# Altium footprint library PcbLib_jp.PcbLib: 178 footprints (part 10 of 12)
Each footprint in its own frame and in the unit in brackets; x right, y up, seen from the top. Pads: shape width x height; smd on the part's side, far side on the other; paste and mask are expansions set on the pad; w line width, h text height; cw(c..) or ccw(c..) is an arc to the next point about the centre after c.
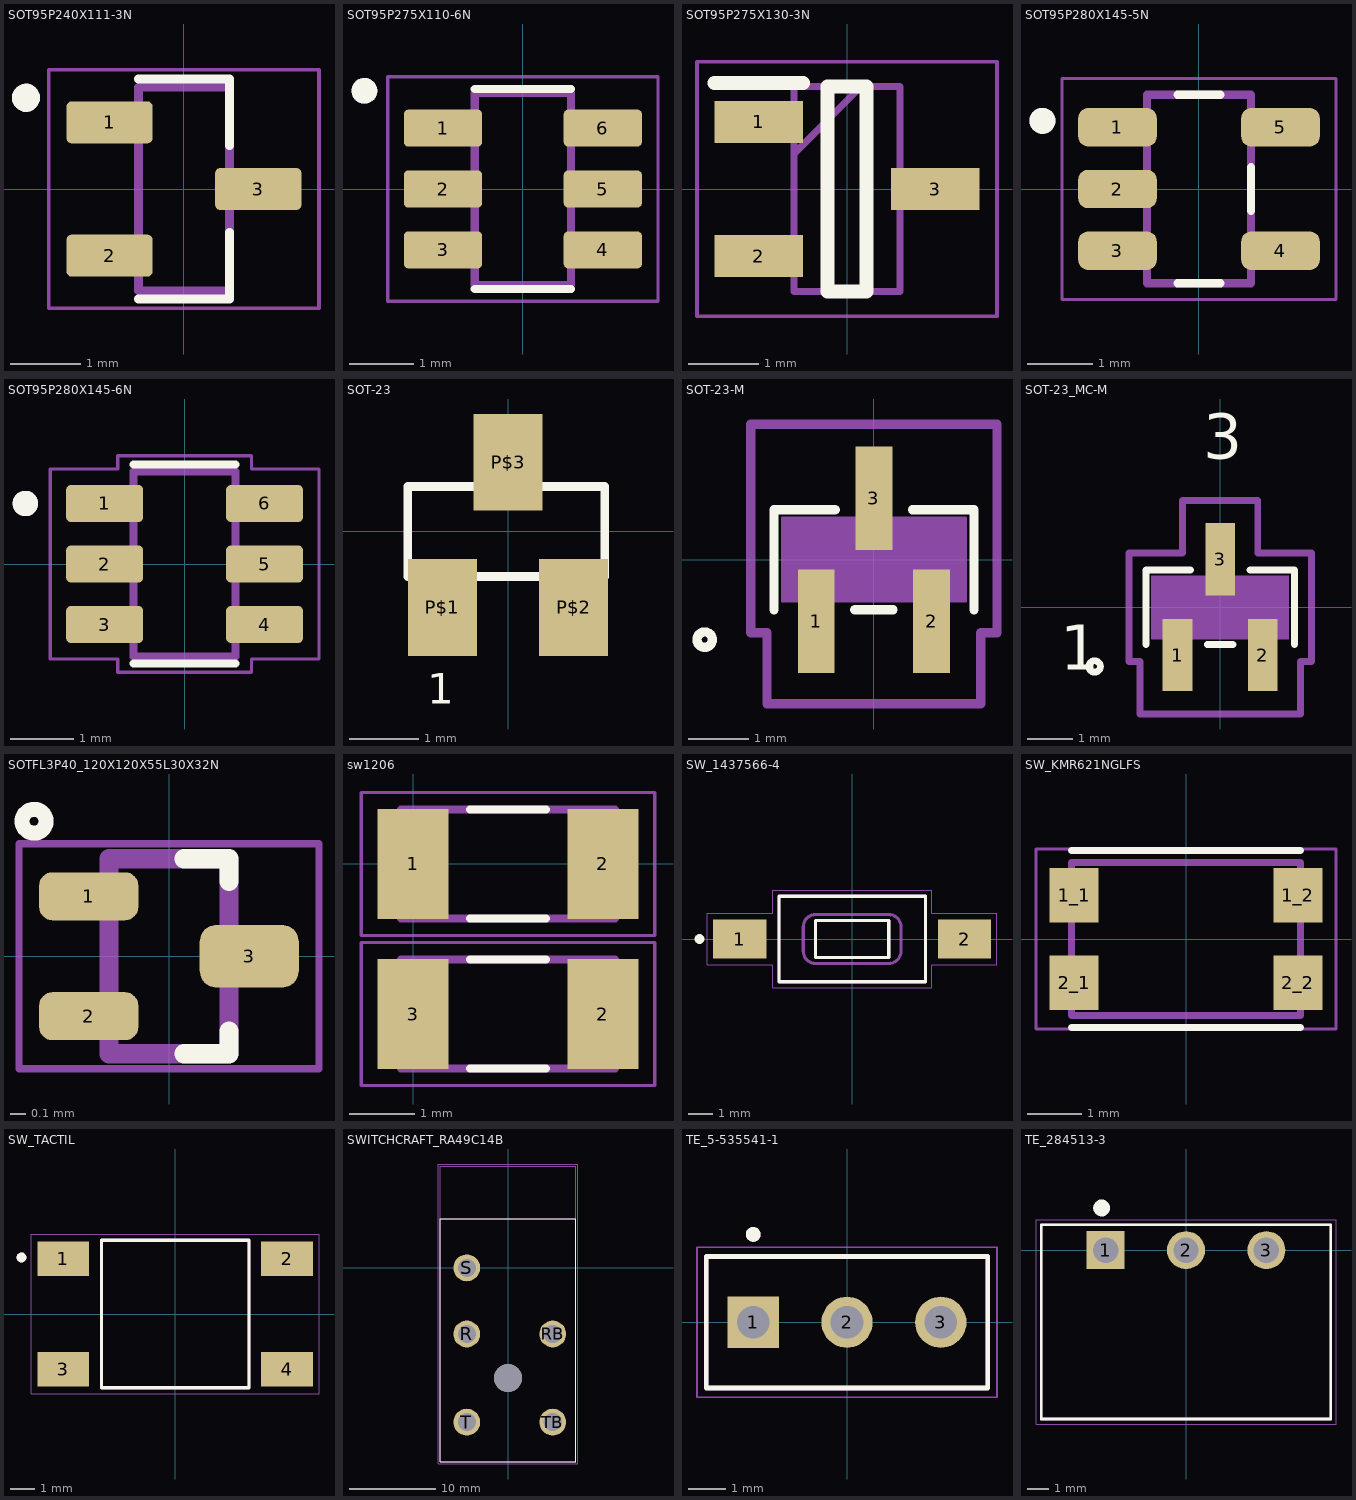
[diagram p9: the footprints below, top view; thin cyan lines are the x and y axes]

## SOT95P240X111-3N [mm]
pads (3):
  rrect25% 1.23x0.6 smd: 1(-1.06,0.95) 2(-1.06,-0.95) 3(1.06,0)
Top Overlay:
  circle w0.2: c-2.25,1.3 r0.1
  lines w0.127: -0.65,-1.57 0.65,-1.57 0.65,-0.62 ; -0.65,1.57 0.65,1.57 0.65,0.62
Mechanical 13:
  circle w0.2: c-2.25,1.3 r0.1
  lines w0.127: -0.65,-1.45 0.65,-1.45 0.65,1.45 -0.65,1.45 -0.65,-1.45
Mechanical 15:
  lines w0.05: -1.925,-1.7 -1.925,1.7 1.925,1.7 1.925,-1.7 -1.925,-1.7
3D body "step_temp.STEP": height 1.1, standoff 0, extent -1.15,-1.45 1.15,1.45

## SOT95P275X110-6N [mm]
pads (6):
  rrect25% 1.22x0.58 smd: 1(-1.245,0.95) 2(-1.245,0) 3(-1.245,-0.95) 4(1.245,-0.95) 5(1.245,0) 6(1.245,0.95)
Top Overlay:
  circle w0.2: c-2.47,1.53 r0.1
  lines w0.127: -0.75,-1.56 0.75,-1.56 ; -0.75,1.56 0.75,1.56
Mechanical 13:
  circle w0.2: c-2.47,1.53 r0.1
  lines w0.127: -0.75,-1.5 0.75,-1.5 0.75,1.5 -0.75,1.5 -0.75,-1.5
Mechanical 15:
  lines w0.05: -2.105,-1.75 2.105,-1.75 2.105,1.75 -2.105,1.75 -2.105,-1.75
3D body "TSOP6_1P70X3P10_ONS.step": height 1.09, standoff 0, extent -1.499,-1.549 1.499,1.549

## SOT95P275X130-3N [mm]
pads (3):
  rect 1.25x0.6 smd: 1(-1.25,0.95) 2(-1.25,-0.95) 3(1.25,0)
Top Overlay:
  lines w0.2: -1.875,1.5 -0.625,1.5 ; -0.275,-1.45 0.275,-1.45 0.275,1.45 -0.275,1.45 -0.275,-1.45
Mechanical 13:
  lines w0.1: -0.75,0.5 0.2,1.45 ; -0.75,-1.45 0.75,-1.45 0.75,1.45 -0.75,1.45 -0.75,-1.45
Mechanical 15:
  lines w0.05: -2.125,-1.8 2.125,-1.8 2.125,1.8 -2.125,1.8 -2.125,-1.8
3D body "M1MA152WAT1G.stp": height 1.3, standoff 0, extent -1.375,-1.45 1.375,1.45

## SOT95P280X145-5N [mm]
pads (5):
  rrect50% 1.21x0.59 smd: 1(-1.255,0.95) 2(-1.255,0) 3(-1.255,-0.95) 4(1.255,-0.95) 5(1.255,0.95)
Top Overlay:
  circle w0.2: c-2.41,1.05 r0.1
  lines w0.127: -0.33,-1.45 0.33,-1.45 ; -0.33,1.45 0.33,1.45 ; 0.8,-0.335 0.8,0.335
Mechanical 13:
  circle w0.2: c-2.41,1.05 r0.1
  lines w0.127: -0.8,-1.45 0.8,-1.45 0.8,1.45 -0.8,1.45 -0.8,-1.45
Mechanical 15:
  lines w0.05: -2.11,-1.7 -2.11,1.7 2.11,1.7 2.11,-1.7 -2.11,-1.7
3D body "CircuitWorks-SOT-23-5.STEP": height 1.35, standoff 0.25, extent -1.45,-1.5 1.05,1.5

## SOT95P280X145-6N [mm]
pads (6):
  rrect25% 1.21x0.58 smd: 1(-1.255,0.95) 2(-1.255,0) 3(-1.255,-0.95) 4(1.255,-0.95) 5(1.255,0) 6(1.255,0.95)
Top Overlay:
  circle w0.2: c-2.5,0.95 r0.1
  lines w0.127: -0.8,-1.56 0.8,-1.56 ; -0.8,1.56 0.8,1.56
Mechanical 13:
  circle w0.2: c-2.5,0.95 r0.1
  lines w0.127: -0.8,-1.45 -0.8,1.45 0.8,1.45 0.8,-1.45 -0.8,-1.45
Mechanical 15:
  lines w0.05: -2.11,-1.49 -2.11,1.49 -1.05,1.49 -1.05,1.7 1.05,1.7 1.05,1.49 2.11,1.49 2.11,-1.49 1.05,-1.49 1.05,-1.7 -1.05,-1.7 -1.05,-1.49 -2.11,-1.49
3D body "User Library-SOT-23-6-THIN.STEP": height 1.1, standoff 0, extent -1.5,-1.5 1.5,1.5

## SOT-23 [mm]
pads (3):
  rect 1x1.4 smd: P$1(-0.95,-1.1) P$2(0.95,-1.1) P$3(0,1)
Top Overlay:
  lines w0.127: -1.25,-0.65 -0.65,-0.65 ; -1.25,-0.65 -1.45,-0.65 -1.45,0.65 -0.3,0.65 ; -1.25,-0.65 -1.25,-1.25 -0.65,-1.25 -0.65,-0.65 ; -0.65,-0.65 0.65,-0.65 ; -0.3,0.65 0.3,0.65 ; -0.3,0.65 -0.3,1.2 0.3,1.2 0.3,0.65 ; 0.3,0.65 1.4,0.65 1.4,-0.65 1.25,-0.65 ; 0.65,-0.65 1.25,-0.65 ; 0.65,-0.65 0.65,-1.25 1.25,-1.25 1.25,-0.65
  text "1" at -1.168,-2.642 h0.76
Mechanical 13:
  text "1" at -1.272,-3.815 h1.27
  text "2" at 1.272,-3.817 h1.27
  text "3" at 0,2.542 h1.27
3D body "FDV301N.STEP": height 1.11, standoff 0, extent -1.402,-1.048 1.499,1.352

## SOT-23-M [mil]
pads (3):
  rect 23.94x67.37 smd paste+0 mask+0: 1(-37.5,-39.97) 2(37.5,-39.97) 3(0,39.97)
Top Overlay:
  circle w6: c-110,-52 r5
  lines w6: -65,-32.5 -65,32.5 -25.07,32.5 ; -12.43,-32.5 12.43,-32.5 ; 25.07,32.5 65,32.5 65,-32.5
Mechanical 13:
  circle w0: c-50,-17.5 r5
  lines w1: -60,-27.5 60,-27.5 60,27.5 -60,27.5 -60,-27.5 ; -47.5,-52 -47.5,-27.5 -27.5,-27.5 -27.5,-52 -47.5,-52 ; -10,27.5 10,27.5 10,52 -10,52 -10,27.5 ; 27.5,-52 27.5,-27.5 47.5,-27.5 47.5,-52 27.5,-52
Mechanical 15:
  region: 60,-27.5 -60,-27.5 -60,27.5 60,27.5
  lines w6: -80,-47.5 -80,88 -31.97,88 80,88 80,47.5 80,-47.5 69.47,-47.5 69.47,-93.65 -69.47,-93.65 -69.47,-47.5 -80,-47.5
3D body: height 10, standoff 0, extent 0,0 10,10
3D body "User Library-sot23-1.STEP": height 39.37, standoff 0, extent -56.48,-49.06 58.49,43.07

## SOT-23_MC-M [mm]
pads (3):
  rect 0.659x1.61 smd paste+0 mask+0: 1(-0.95,-1.065) 2(0.95,-1.065) 3(0,1.065)
Top Overlay:
  circle w0.152: c-2.795,-1.32 r0.127
  lines w0.152: -1.652,-0.827 -1.652,0.827 -0.662,0.827 ; -0.288,-0.827 0.288,-0.827 ; 0.662,0.827 1.652,0.827 1.652,-0.827
  text "1" at -3.556,-1.397 h1
  text "3" at -0.381,3.302 h1
Mechanical 13:
  circle w0: c-1.271,-0.446 r0.127
  lines w0.025: -1.525,-0.7 1.525,-0.7 1.525,0.7 -1.525,0.7 -1.525,-0.7 ; -1.229,-1.32 -1.229,-0.7 -0.671,-0.7 -0.671,-1.32 -1.229,-1.32 ; -0.279,0.7 0.279,0.7 0.279,1.32 -0.279,1.32 -0.279,0.7 ; 0.671,-1.32 0.671,-0.7 1.229,-0.7 1.229,-1.32 0.671,-1.32
Mechanical 15:
  region: 1.525,-0.7 -1.525,-0.7 -1.525,0.7 1.525,0.7
  lines w0.152: -2.033,-1.208 -2.033,1.208 -0.837,1.208 -0.837,2.378 0.837,2.378 0.837,1.208 2.033,1.208 2.033,-1.208 1.787,-1.208 1.787,-2.378 -1.787,-2.378 -1.787,-1.208 -2.033,-1.208
3D body: height 0.25, standoff 0, extent 0,0 0.254,0.254
3D body "SOT-23_MC-M.step": height 1.12, standoff 0, extent -1.525,-1.193 1.525,1.447

## SOTFL3P40_120X120X55L30X32N [mm]
pads (3):
  rrect54% 0.66x0.32 smd: 1(-0.535,0.4) 2(-0.535,-0.4)
  rrect54% 0.66x0.42 smd: 3(0.535,0)
Top Overlay:
  circle w0.1: c-0.9,0.9 r0.08
  lines w0.127: 0.1,-0.65 0.4,-0.65 0.4,-0.5 ; 0.1,0.65 0.4,0.65 0.4,0.5
Mechanical 13:
  lines w0.127: -0.4,-0.65 0.4,-0.65 0.4,0.65 -0.4,0.65 -0.4,-0.65
Mechanical 15:
  lines w0.05: -1,-0.75 1,-0.75 1,0.75 -1,0.75 -1,-0.75
3D body "RUM001L02T2CL.STEP": height 0.55, standoff 0, extent -0.62,-0.58 0.58,0.62

## sw1206 [mm]
pads (4):
  rect 1.08x1.68 smd: 1(0,0) 2(2.89,-2.286) 2(2.89,0) 3(0,-2.286)
Top Overlay:
  lines w0.127: 0.865,-3.116 2.025,-3.116 ; 0.865,-1.456 2.025,-1.456 ; 0.865,-0.83 2.025,-0.83 ; 0.865,0.83 2.025,0.83
Mechanical 13:
  lines w0.127: -0.185,-3.116 3.075,-3.116 ; -0.185,-3.116 -0.185,-1.456 ; -0.185,-3.116 3.075,-3.116 ; -0.185,-3.116 -0.185,-1.456 ; -0.185,-1.456 3.075,-1.456 ; -0.185,-1.456 3.075,-1.456 ; -0.185,-0.83 -0.185,0.83 ; -0.185,-0.83 3.075,-0.83 ; -0.185,-0.83 -0.185,0.83 ; -0.185,-0.83 3.075,-0.83 ; -0.185,0.83 3.075,0.83 ; -0.185,0.83 3.075,0.83 ; 3.075,-3.116 3.075,-1.456 ; 3.075,-3.116 3.075,-1.456 ; 3.075,-0.83 3.075,0.83 ; 3.075,-0.83 3.075,0.83
Mechanical 16:
  lines w0.05: -0.792,-3.376 3.682,-3.376 3.682,-1.196 -0.792,-1.196 -0.792,-3.376 ; -0.792,-1.09 -0.792,1.09 3.682,1.09 3.682,-1.09 -0.792,-1.09
3D body "User Library-CR3216-1206.STEP": height 1.6, standoff 1, extent -0.178,-0.8 3.022,0.8
3D body "User Library-CR3216-1206.STEP": height 1.6, standoff 1, extent -0.178,-3.086 3.022,-1.486

## SW_1437566-4 [mm]
pads (2):
  rect 2.18x1.6 smd: 1(-4.6,0) 2(4.6,0)
Top Overlay:
  circle w0.2: c-6.25,0 r0.1
  lines w0.127: -3,-1.75 -3,1.75 3,1.75 3,-1.75 -3,-1.75 ; -1.5,-0.75 -1.5,0.75 1.5,0.75 1.5,-0.75 -1.5,-0.75
Mechanical 13:
  circle w0.2: c-4.6,0 r0.1
  lines w0.127: -3,-1.75 -3,1.75 3,1.75 3,-1.75 -3,-1.75 ; -2,-0.5 ccw(c-1.5,-0.5) -1.5,-1 1.5,-1 ccw(c1.5,-0.5) 2,-0.5 2,0.5 ccw(c1.5,0.5) 1.5,1 -1.5,1 ccw(c-1.5,0.5) -2,0.5 -2,-0.5 ; -1.5,-0.75 -1.5,0.75 1.5,0.75 1.5,-0.75 -1.5,-0.75
Mechanical 15:
  lines w0.05: -5.93,-1.05 -3.25,-1.05 -3.25,-2 3.25,-2 3.25,-1.05 5.93,-1.05 5.93,1.05 3.25,1.05 3.25,2 -3.25,2 -3.25,1.05 -5.93,1.05 -5.93,-1.05
3D body "1437566-4.stp": height 5, standoff 0.59, extent -4.964,-1.63 5.005,1.87

## SW_KMR621NGLFS [mm]
pads (4):
  rect 0.9x1 smd: 1_1(-2.05,0.8) 1_2(2.05,0.8) 2_1(-2.05,-0.8) 2_2(2.05,-0.8)
Top Overlay:
  lines w0.127: -2.1,-1.62 2.1,-1.62 ; -2.1,1.62 2.1,1.62
Mechanical 13:
  lines w0.127: -2.1,-1.4 -2.1,1.4 2.1,1.4 2.1,-1.4 -2.1,-1.4
Mechanical 15:
  lines w0.05: -2.75,-1.65 -2.75,1.65 2.75,1.65 2.75,-1.65 -2.75,-1.65
3D body "KMR621NG LFS--3DModel-STEP-56544.STEP": height 2.5, standoff 0.6, extent -2.31,-1.31 2.29,1.49

## SW_TACTIL [mm]
pads (4):
  rect 2.1x1.4 smd: 1(-4.55,2.25) 2(4.55,2.25) 3(-4.55,-2.25) 4(4.55,-2.25)
Top Overlay:
  circle w0.2: c-6.25,2.3 r0.1
  lines w0.127: -3,-3 -3,3 3,3 3,-3 -3,-3
Mechanical 13:
  circle w0.2: c-6.25,2.3 r0.1
  lines w0.127: -3,-3 3,-3 3,3 -3,3 -3,-3
Mechanical 15:
  lines w0.05: -5.85,-3.25 5.85,-3.25 5.85,3.25 -5.85,3.25 -5.85,-3.25
3D body "User Library-switch.STEP": height 5, standoff 0, extent -4.424,-2.949 4.576,3.051

## SWITCHCRAFT_RA49C14B [mm]
pads (6):
  round 3.096 hole 2.08: R(-4.75,-7.62) RB(5.16,-7.62) S(-4.75,0) T(-4.75,-17.78) TB(5.16,-17.78)
  round 3.25 hole 3.25 unplated: ""(0,-12.7)
Top Overlay:
  lines w0.127: -7.81,-22.36 7.81,-22.36 7.81,5.69 -7.81,5.69 -7.81,-22.36
Top Solder:
  circle w1.879: c0,-12.7 r0.94
Bottom Solder:
  circle w1.879: c0,-12.7 r0.94
Mechanical 13:
  lines w0.127: -7.81,5.69 -7.81,11.73 7.81,11.73 7.81,5.69 ; -7.81,5.69 -7.81,-22.36 7.81,-22.36 7.81,5.69 ; -7.81,5.69 7.81,5.69
  text "PCB EDGE" at -4.5,6.29 h1.27
Mechanical 15:
  lines w0.05: -8.06,-22.61 8.06,-22.61 8.06,11.98 -8.06,11.98 -8.06,-22.61
3D body "RA49C14B--3DModel-STEP-1.STEP": height 15.81, standoff -9.25, extent -7.811,-22.3 7.81,24.328

## TE_5-535541-1 [mm]
pads (3):
  rect 1.388x1.388 hole 0.88: 1(-2.54,0)
  round 1.388 hole 0.88: 2(0,0) 3(2.54,0)
Top Overlay:
  circle w0.2: c-2.54,2.38 r0.1
  lines w0.127: -3.81,-1.78 3.81,-1.78 3.81,1.78 -3.81,1.78 -3.81,-1.78
Mechanical 13:
  circle w0.2: c-2.54,2.38 r0.1
  lines w0.127: -3.81,-1.78 3.81,-1.78 3.81,1.78 -3.81,1.78 -3.81,-1.78
Mechanical 15:
  lines w0.05: -4.06,-2.03 4.06,-2.03 4.06,2.03 -4.06,2.03 -4.06,-2.03
3D body "User Library-Jumper SL2.STEP": height 9.5, standoff -2.6, extent -1.3,-1.3 3.7,1.24

## TE_284513-3 [mm]
pads (3):
  rect 1.8x1.8 hole 1.2: 1(-3.81,0)
  round 1.8 hole 1.2: 2(0,0) 3(3.81,0)
Top Overlay:
  circle w0.4: c-4,2 r0.2
  lines w0.127: -6.86,-8 -6.86,1.2 6.86,1.2 6.86,-8 -6.86,-8
Mechanical 13:
  lines w0.127: -6.86,-8 6.86,-8 6.86,1.2 -6.86,1.2 -6.86,-8
Mechanical 15:
  lines w0.05: -7.11,-8.25 7.11,-8.25 7.11,1.45 -7.11,1.45 -7.11,-8.25
3D body "284513-3--3DModel-STEP-1.STEP": height 7.3, standoff -3.4, extent -6.86,-8 6.86,1.2